# Altium schematic symbol library GyokuRe.SchLib: 1131 symbols (part 8 of 8)
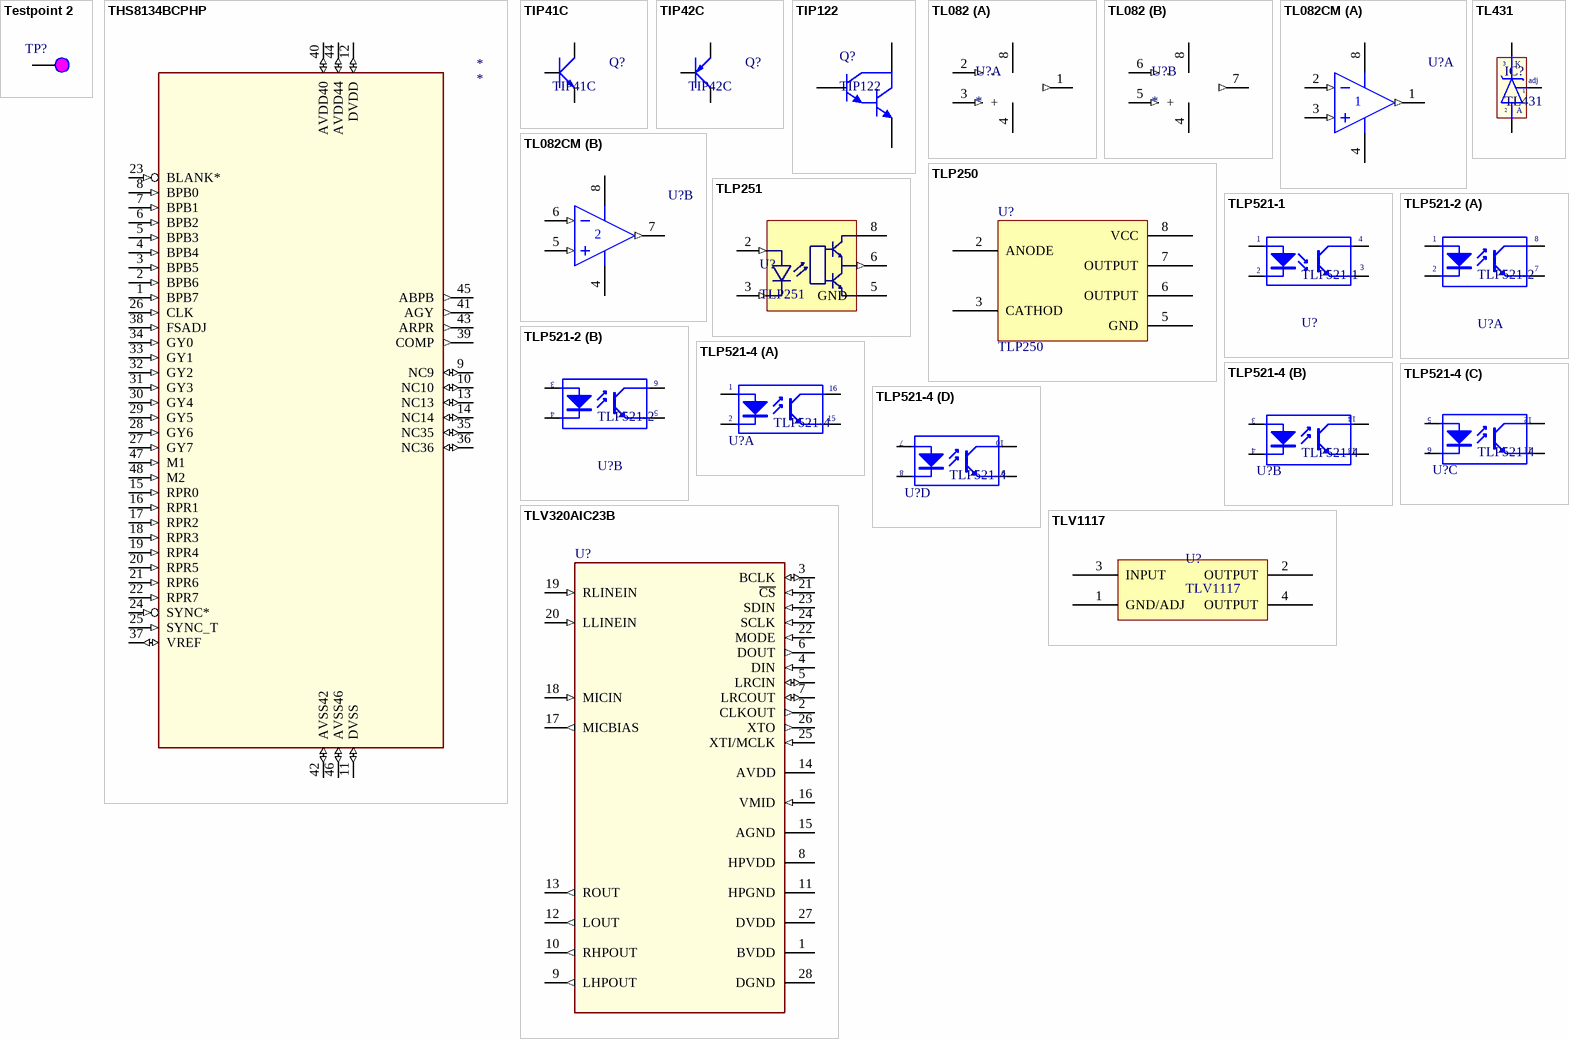
[diagram p56: symbols Testpoint 2 to TLV1117]

## TLV320AIC23B
designator U?  (value not drawn)
utomotive Catalog Stereo Audio CODEC, 8- to 96 kHz, w/Integrated Headphone Amp; Manufacturer: Texas Instruments; Manufacturer P/N: TLV320AIC23B-Q1; Sampling Rate: 96Khz; Resolution: 24-bit; Analog Supply: 2.7 - 3.6 V; Digital Supply: 1.42 - 3.6 V; ComponentLink1Description: Digikey Part Link; ComponentLink2Description: Open Datasheet; ComponentLink2URL: H:\LIBRARY\LIBRARY.Datasheet\tlv320aic23b-q1.pdf
footprint SSOP-28.AIC23 (SSOP, Plastic; 28 Leads; Body Width 5.2 mm; Pitch 0.65 mm)
pins: 1 BVDD (power) "Buffer supply input. Voltage range is from 2.7 V to 3.6 V.", 2 CLKOUT (out) "Clock output. This is a buffered version of the XTI input and is available in 1X or 1/2X frequencies of XTI. Bit 07 in  the sample rate control register controls frequency selection", 3 BCLK (io) "I2S serial-bit clock", 4 DIN (in) "I2S format serial data input to the sigma-delta stereo DAC", 5 LRCIN (io) "I2S DAC-word clock signal.", 6 DOUT (out) "I2S format serial data output from the sigma-delta stereo ADC", 7 LRCOUT (io) "I2S ADC-word clock signal.", 8 HPVDD (power) "Analog headphone amplifier supply input. Voltage level is 3.3 V nominal.", 9 LHPOUT (out) "Left stereo mixer-channel amplified headphone output", 10 RHPOUT (out) "Right stereo mixer-channel amplified headphone output", 11 HPGND (power) "Analog headphone amplifier supply return", 12 LOUT (out) "Left stereo mixer-channel line output", 13 ROUT (out) "Right stereo mixer-channel line output", 14 AVDD (power) "Analog supply input. Voltage level is 3.3 V nominal.", 15 AGND (power) "Analog supply return", 16 VMID (in) "Midrail voltage decoupling input", 17 MICBIAS (out) "Buffered low-noise-voltage output suitable for electret-microphone-capsule biasing", 18 MICIN (in) "Buffered amplifier input suitable for use with electret-microphone capsules", 19 RLINEIN (in) "Right stereo-line input channel", 20 LLINEIN (in) "Left stereo-line input channe", 21 ~{CS} (in) "Control port input latch/address select. For SPI control mode this input acts as the data latch control. For 2-wire  control mode this input defines the seventh bit in the device address field", 22 MODE (in) "Serial-interface-mode input", 23 SDIN (in) "Control-port serial-data input", 24 SCLK (in) "Control-port serial-data clock", 25 XTI/MCLK (in) "Crystal or external-clock input", 26 XTO (out) "Crystal output", 27 DVDD (power) "Digital supply input. Voltage range is 1.4 V to 3.6 V.", 28 DGND (power) "Digital supply return"

## TLV1117
designator U?
Adjustable And Fixed Low-Dropout Voltage Regulator
footprint SOT223-4M (SOT223, 4-Leads, Body 6.5x3.5mm, Pitch 2.3mm, Lead Span 7mm, IPC Low Density)
footprint SOT223-4M-A (Connector; Header; 3 Position; Solder Pad 35mil)
pins: 1 GND/ADJ, 2 OUTPUT, 3 INPUT, 4 OUTPUT

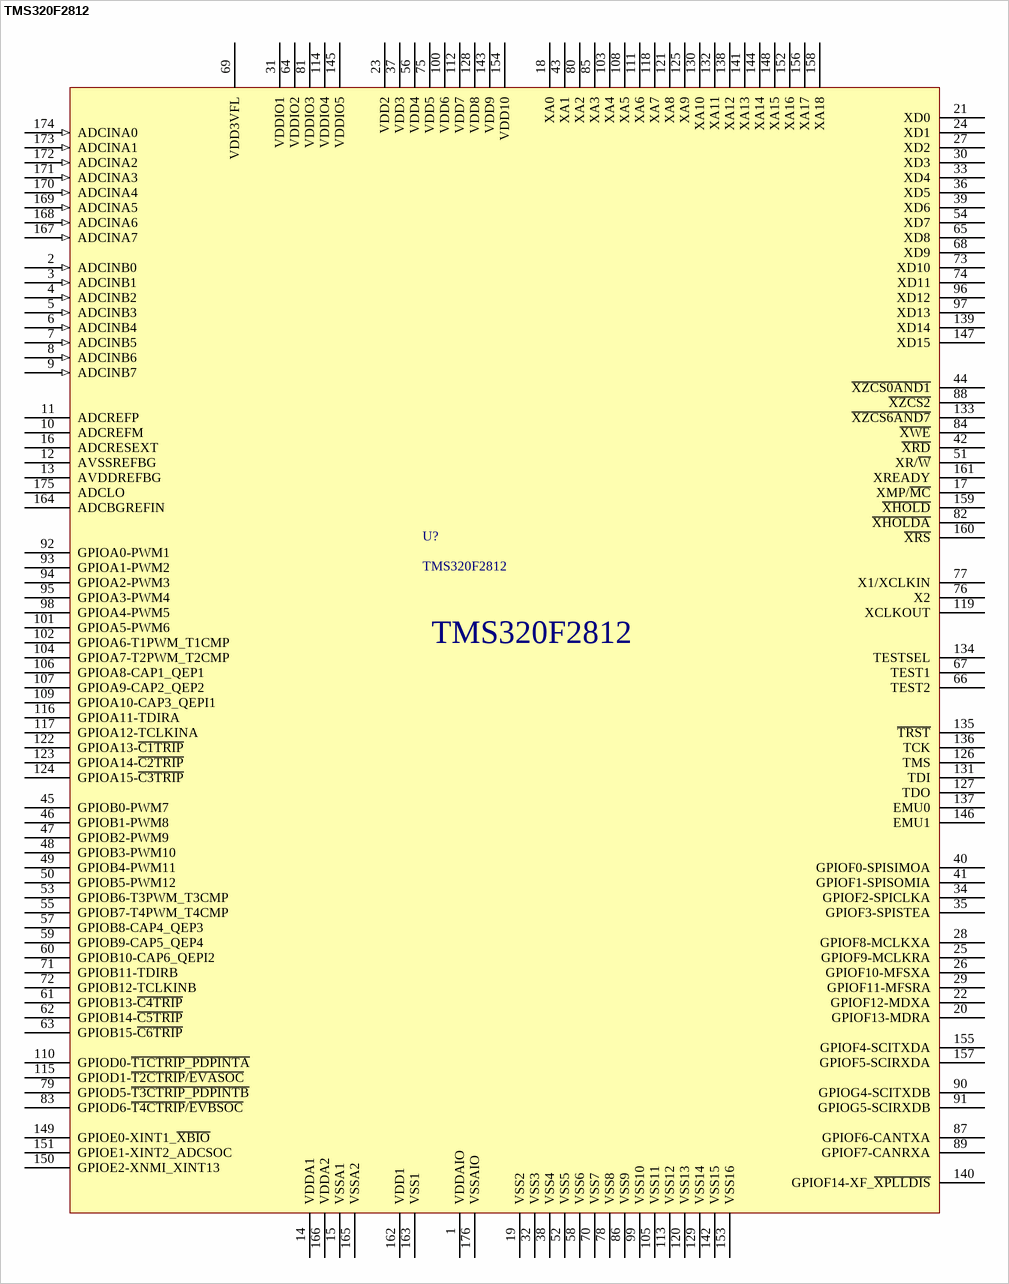
[diagram p44: symbol TMS320F2812]

## TMS320F2812
designator U?
Digital Signal Processors; Manufacture: Texas Instruments
footprint QFP-24x24-0.5-176 (176-Pin Plastic Quad Flat Pack, Body 24mmx24mm, Pitch 0.5 m)
footprint QFP-24x24-0.5-176-A (176-Pin Plastic Quad Flat Pack, Body 24mmx24mm, Pitch 0.5 m; Adaptor)
pins: 1 VDDAIO, 2 ADCINB0 (in), 3 ADCINB1 (in), 4 ADCINB2 (in), 5 ADCINB3 (in), 6 ADCINB4 (in), 7 ADCINB5 (in), 8 ADCINB6 (in), 9 ADCINB7 (in), 10 ADCREFM, 11 ADCREFP, 12 AVSSREFBG, 13 AVDDREFBG, 14 VDDA1, 15 VSSA1, 16 ADCRESEXT, 17 XMP/~{MC}, 18 XA0, 19 VSS2, 20 GPIOF13-MDRA, 21 XD0, 22 GPIOF12-MDXA, 23 VDD2, 24 XD1, 25 GPIOF9-MCLKRA, 26 GPIOF10-MFSXA, 27 XD2, 28 GPIOF8-MCLKXA, 29 GPIOF11-MFSRA, 30 XD3, 31 VDDIO1, 32 VSS3, 33 XD4, 34 GPIOF2-SPICLKA, 35 GPIOF3-SPISTEA, 36 XD5, 37 VDD3, 38 VSS4, 39 XD6, 40 GPIOF0-SPISIMOA, 41 GPIOF1-SPISOMIA, 42 ~{XRD}, 43 XA1, 44 ~{XZCS0AND1}, 45 GPIOB0-PWM7, 46 GPIOB1-PWM8, 47 GPIOB2-PWM9, 48 GPIOB3-PWM10, 49 GPIOB4-PWM11, 50 GPIOB5-PWM12, 51 XR/~{W}, 52 VSS5, 53 GPIOB6-T3PWM_T3CMP, 54 XD7, 55 GPIOB7-T4PWM_T4CMP, 56 VDD4, 57 GPIOB8-CAP4_QEP3, 58 VSS6, 59 GPIOB9-CAP5_QEP4, 60 GPIOB10-CAP6_QEPI2, 61 GPIOB13-~{C4TRIP}, 62 GPIOB14-~{C5TRIP}, 63 GPIOB15-~{C6TRIP}, 64 VDDIO2, 65 XD8, 66 TEST2, 67 TEST1, 68 XD9, 69 VDD3VFL, 70 VSS7, 71 GPIOB11-TDIRB, 72 GPIOB12-TCLKINB, 73 XD10, 74 XD11, 75 VDD5, 76 X2, 77 X1/XCLKIN, 78 VSS8, 79 GPIOD5-~{T3CTRIP_PDPINTB}, 80 XA2, 81 VDDIO3, 82 ~{XHOLDA}, 83 GPIOD6-~{T4CTRIP}/~{EVBSOC}, 84 ~{XWE}, 85 XA3, 86 VSS9, 87 GPIOF6-CANTXA, 88 ~{XZCS2}, 89 GPIOF7-CANRXA, 90 GPIOG4-SCITXDB, 91 GPIOG5-SCIRXDB, 92 GPIOA0-PWM1, 93 GPIOA1-PWM2, 94 GPIOA2-PWM3, 95 GPIOA3-PWM4, 96 XD12, 97 XD13, 98 GPIOA4-PWM5, 99 VSS10, 100 VDD6, 101 GPIOA5-PWM6, 102 GPIOA6-T1PWM_T1CMP, 103 XA4, 104 GPIOA7-T2PWM_T2CMP, 105 VSS11, 106 GPIOA8-CAP1_QEP1, 107 GPIOA9-CAP2_QEP2, 108 XA5, 109 GPIOA10-CAP3_QEPI1, 110 GPIOD0-~{T1CTRIP_PDPINTA}, 111 XA6, 112 VDD7, 113 VSS12, 114 VDDIO4, 115 GPIOD1-~{T2CTRIP}/~{EVASOC}, 116 GPIOA11-TDIRA, 117 GPIOA12-TCLKINA, 118 XA7, 119 XCLKOUT, 120 VSS13, 121 XA8, 122 GPIOA13-~{C1TRIP}, 123 GPIOA14-~{C2TRIP}, 124 GPIOA15-~{C3TRIP}, 125 XA9, 126 TMS, 127 TDO, 128 VDD8, 129 VSS14, 130 XA10, 131 TDI, 132 XA11, 133 ~{XZCS6AND7}, 134 TESTSEL, 135 ~{TRST}, 136 TCK, 137 EMU0, 138 XA12, 139 XD14, 140 GPIOF14-XF_~{XPLLDIS}, 141 XA13, 142 VSS15, 143 VDD9, 144 XA14, 145 VDDIO5, 146 EMU1, 147 XD15, 148 XA15, 149 GPIOE0-XINT1_~{XBIO}, 150 GPIOE2-XNMI_XINT13, 151 GPIOE1-XINT2_ADCSOC, 152 XA16, 153 VSS16, 154 VDD10, 155 GPIOF4-SCITXDA, 156 XA17, 157 GPIOF5-SCIRXDA, 158 XA18, 159 ~{XHOLD}, 160 ~{XRS}, 161 XREADY, 162 VDD1, 163 VSS1, 164 ADCBGREFIN, 165 VSSA2, 166 VDDA2, 167 ADCINA7 (in), 168 ADCINA6 (in), 169 ADCINA5 (in), 170 ADCINA4 (in), 171 ADCINA3 (in), 172 ADCINA2 (in), 173 ADCINA1 (in), 174 ADCINA0 (in), 175 ADCLO, 176 VSSAIO

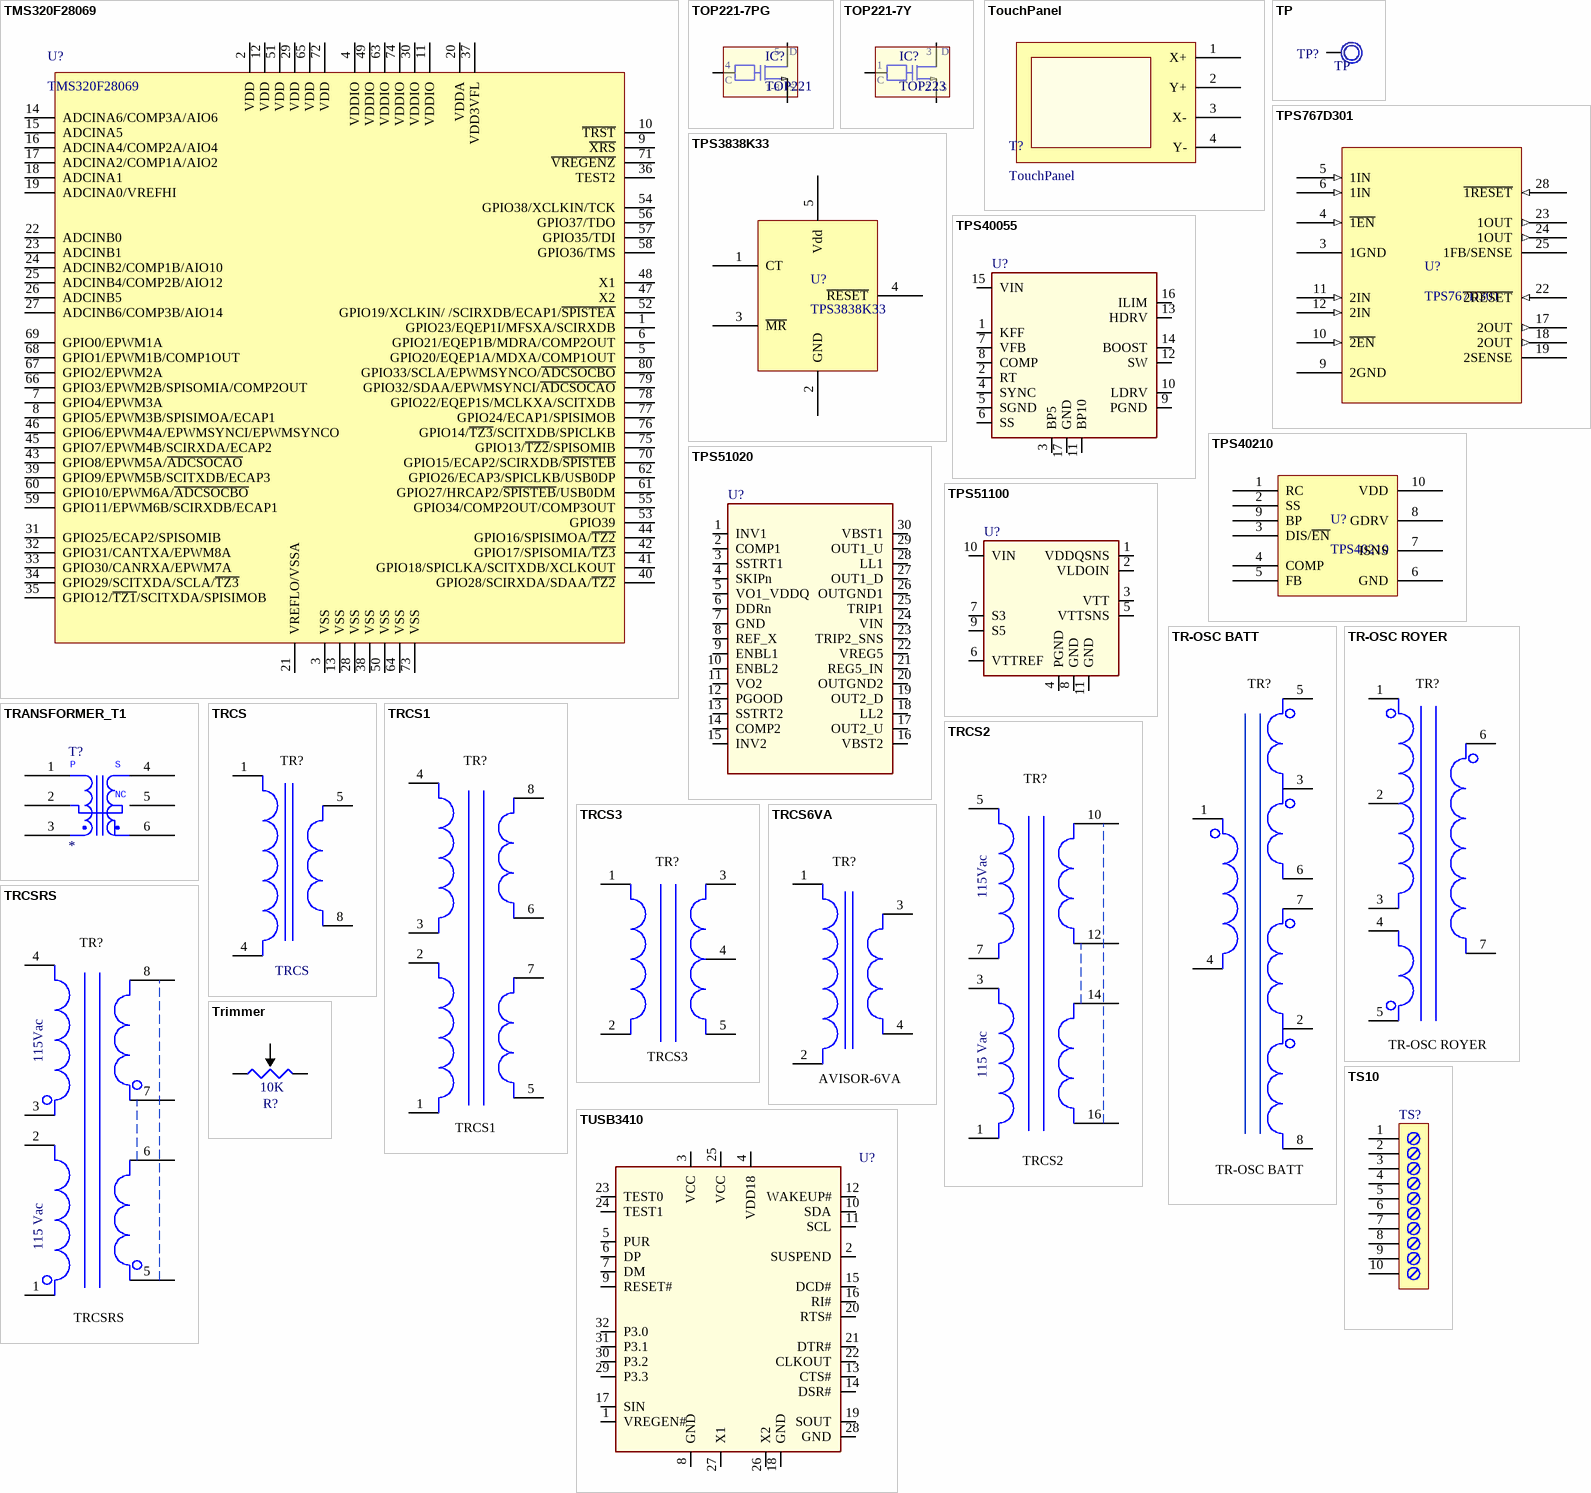
[diagram p45: symbols TMS320F28069 to TUSB3410]

## TMS320F28069
designator U?
Manufacture Company: Texas Instrument
footprint TQFP-80_L (80-Pin Thin Plastic Quad Flat Pack 0.5 mm Pitch, 1.0/0.1 mm Lead Form, IPC High Density)
pins: 1 GPIO23/EQEP1I/MFSXA/SCIRXDB, 2 VDD, 3 VSS, 4 VDDIO, 5 GPIO20/EQEP1A/MDXA/COMP1OUT, 6 GPIO21/EQEP1B/MDRA/COMP2OUT, 7 GPIO4/EPWM3A, 8 GPIO5/EPWM3B/SPISIMOA/ECAP1, 9 ~{XRS}, 10 ~{TRST}, 11 VDDIO, 12 VDD, 13 VSS, 14 ADCINA6/COMP3A/AIO6, 15 ADCINA5, 16 ADCINA4/COMP2A/AIO4, 17 ADCINA2/COMP1A/AIO2, 18 ADCINA1, 19 ADCINA0/VREFHI, 20 VDDA, 21 VREFLO/VSSA, 22 ADCINB0, 23 ADCINB1, 24 ADCINB2/COMP1B/AIO10, 25 ADCINB4/COMP2B/AIO12, 26 ADCINB5, 27 ADCINB6/COMP3B/AIO14, 28 VSS, 29 VDD, 30 VDDIO, 31 GPIO25/ECAP2/SPISOMIB, 32 GPIO31/CANTXA/EPWM8A, 33 GPIO30/CANRXA/EPWM7A, 34 GPIO29/SCITXDA/SCLA/~{TZ3}, 35 GPIO12/~{TZ1}/SCITXDA/SPISIMOB, 36 TEST2, 37 VDD3VFL, 38 VSS, 39 GPIO9/EPWM5B/SCITXDB/ECAP3, 40 GPIO28/SCIRXDA/SDAA/~{TZ2}, 41 GPIO18/SPICLKA/SCITXDB/XCLKOUT, 42 GPIO17/SPISOMIA/~{TZ3}, 43 GPIO8/EPWM5A/~{ADCSOCAO}, 44 GPIO16/SPISIMOA/~{TZ2}, 45 GPIO7/EPWM4B/SCIRXDA/ECAP2, 46 GPIO6/EPWM4A/EPWMSYNCI/EPWMSYNCO, 47 X2, 48 X1, 49 VDDIO, 50 VSS, 51 VDD, 52 GPIO19/XCLKIN/ /SCIRXDB/ECAP1/~{SPISTEA}, 53 GPIO39, 54 GPIO38/XCLKIN/TCK, 55 GPIO34/COMP2OUT/COMP3OUT, 56 GPIO37/TDO, 57 GPIO35/TDI, 58 GPIO36/TMS, 59 GPIO11/EPWM6B/SCIRXDB/ECAP1, 60 GPIO10/EPWM6A/~{ADCSOCBO}, 61 GPIO27/HRCAP2/~{SPISTEB}/USB0DM, 62 GPIO26/ECAP3/SPICLKB/USB0DP, 63 VDDIO, 64 VSS, 65 VDD, 66 GPIO3/EPWM2B/SPISOMIA/COMP2OUT, 67 GPIO2/EPWM2A, 68 GPIO1/EPWM1B/COMP1OUT, 69 GPIO0/EPWM1A, 70 GPIO15/ECAP2/SCIRXDB/~{SPISTEB}, 71 ~{VREGENZ}, 72 VDD, 73 VSS, 74 VDDIO, 75 GPIO13/~{TZ2}/SPISOMIB, 76 GPIO14/~{TZ3}/SCITXDB/SPICLKB, 77 GPIO24/ECAP1/SPISIMOB, 78 GPIO22/EQEP1S/MCLKXA/SCITXDB, 79 GPIO32/SDAA/EPWMSYNCI/~{ADCSOCAO}, 80 GPIO33/SCLA/EPWMSYNCO/~{ADCSOCBO}

## TOP221-7PG
designator IC?, comment TOP221
Family Three-terminal Off-line PWM Switch
footprint DIP8/W0.3 (8 PIN, W 300mil, Pin to pin 100mil)
footprint SO-8 (8-Pin Small Outline Integrated Circuit 1.27 mm Pitch, IPC Medium Density)
pins: 1 S, 2 S, 3 S, 4 C, 5 D, 6 S, 7 S, 8 S
text: 1-8

## TOP221-7Y
designator IC?, comment TOP223
Family Three-terminal Off-line PWM Switch; Designed by: VanDungEvn
footprint QTO-220 (TO-220 - 1-2-3)
pins: 1 C, 2 C, 3 C
text: D; S

## TouchPanel
designator T?
4 wires touch panel; Creator: Nguyen Ba Bien; Date Created: 14-04-2010
footprint HDR1X4H (Connector; Header; 4 Position; Right Angle)
pins: 1 X+, 2 Y+, 3 X-, 4 Y-

## TP
designator TP?
Test Point; Value: Test Point
footprint TEST_POINT_2MM (Test point)
footprint TEST_POINT_4MM (Test Pad, 1-Pin)
footprint TEST_POINT_8MM (Jac cap 6ly)
pins: 1

## TPS767D301
designator U?
Dual-Output Low-Dropout Voltage Regulator, ADJ/3.3V; Manufacture: Texas Instruments
footprint HSOP-9.8x4.4-0.65-28 (Small Outline Pakage; 28 Leads; Body 4.4 mm; Pitch 0.65 mm; Heatsink)
pins: 3 1GND, 4 ~{1EN} (in), 5 1IN (in), 6 1IN (in), 9 2GND, 10 ~{2EN} (in), 11 2IN (in), 12 2IN (in), 17 2OUT (out), 18 2OUT (out), 19 2SENSE, 22 ~{2RESET} (in), 23 1OUT (out), 24 1OUT (out), 25 1FB/SENSE, 28 ~{1RESET} (in)

## TPS3838K33
designator U?
NanoPower Supervisory Circuits 3.3V
footprint SOT23-2.9x1.6-0.95-5AL (SOT23, 5-Leads, Body 2.9x1.6mm, Pitch 0.95mm, Lead Span 2.8mm, IPC High Density)
pins: 1 CT, 2 GND, 3 ~{MR}, 4 ~{RESET}, 5 Vdd

## TPS40055
designator U?  (value not drawn)
Wide Input (8V-40V) up to 1MHz Frequency Synchronous Buck Controller, source/sink; Manufacturer: Texas Instruments; Iout(Max): 1A; Switching Frequency(Max): 1000Khz; Vout: 0.7-35V; Vin: 8-40V; ComponentLink1Description: Digikey Part Link; ComponentLink2Description: Open Datasheet; ComponentLink2URL: H:\LIBRARY\LIBRARY.Datasheet\
pins: 1 KFF, 2 RT, 3 BP5, 4 SYNC, 5 SGND, 6 SS, 7 VFB, 8 COMP, 9 PGND, 10 LDRV, 11 BP10, 12 SW, 13 HDRV, 14 BOOST, 15 VIN, 16 ILIM, 17 GND

## TPS40210
designator U?
4.5-V to 52-V Input Current Mode Boost Controller
footprint SON-3x3-0.5-10 (SON, 10-Leads, Body 3x3 mm, Pitch 0.5mm, IPC Low Density)
pins: 1 RC, 2 SS, 3 DIS/~{EN}, 4 COMP, 5 FB, 6 GND, 7 ISNS, 8 GDRV, 9 BP, 10 VDD

## TPS51020
designator U?  (value not drawn)
Dual, DDR selectable, Synchronous buck controller; Manufacturer: Texas Instruments; Iout(Max): 20A; Switching Frequency: 450Khz; Vout: 0.9-24V; Vin: 4.5-28V; ComponentLink1Description: Digikey Part Link; ComponentLink2Description: Open Datasheet; ComponentLink2URL: H:\LIBRARY\LIBRARY.Datasheet\
pins: 1 INV1, 2 COMP1, 3 SSTRT1, 4 SKIPn, 5 VO1_VDDQ, 6 DDRn, 7 GND, 8 REF_X, 9 ENBL1, 10 ENBL2, 11 VO2, 12 PGOOD, 13 SSTRT2, 14 COMP2, 15 INV2, 16 VBST2, 17 OUT2_U, 18 LL2, 19 OUT2_D, 20 OUTGND2, 21 REG5_IN, 22 VREG5, 23 TRIP2_SNS, 24 VIN, 25 TRIP1, 26 OUTGND1, 27 OUT1_D, 28 LL1, 29 OUT1_U, 30 VBST1

## TPS51100
designator U?  (value not drawn)
3A Source/Sink DDR terminator Regulator; Manufacturer: Texas Instruments; Vin: 4.75-5.25V; ComponentLink1Description: Digikey Part Link; ComponentLink2Description: Open Datasheet; ComponentLink2URL: H:\LIBRARY\LIBRARY.Datasheet\; Iout(Max): 3A
footprint 10MSOP-PowerPAD (Footprint not found)
pins: 1 VDDQSNS, 2 VLDOIN, 3 VTT, 4 PGND, 5 VTTSNS, 6 VTTREF, 7 S3, 8 GND (power), 9 S5, 10 VIN, 11 GND (power)

## TR-OSC BATT
designator TR?
Tr oscillator for battery power - E30; Vendor: Digikey; Value: *; Published: 13-April-2009; Publisher: Hoang Nguyen; ComponentLink1Description: Digikey Part Link; ComponentLink2Description: Open Datasheet; ComponentLink2URL: H:\LIBRARY\LIBRARY.Datasheet\
footprint TR-OSC BATT (Tr oscillator for battery power - E30)
pins: 1, 2, 3, 4, 5, 6, 7, 8

## TR-OSC ROYER
designator TR?
Royer oscillator - E30; Vendor: Digikey; Value: *; Published: 13-April-2009; Publisher: Hoang Nguyen; ComponentLink1Description: Digikey Part Link; ComponentLink2Description: Open Datasheet; ComponentLink2URL: H:\LIBRARY\LIBRARY.Datasheet\
footprint TR-OSC ROYER (Royer oscillator - E30)
pins: 1, 2, 3, 4, 5, 6, 7

## TRANSFORMER_T1
designator T?
ComponentLink1Description: Digikey Part Link; ComponentLink2Description: Open Datasheet; ComponentLink2URL: H:\LIBRARY\LIBRARY.Datasheet\
pins: 1 IN1, 2 OUT-CT, 3 IN2, 4 OUT1, 5 NC, 6 OUT2
text: P; S

## TRCS
designator TR?  (value not drawn)
Power 3VA - Body 40x32 mm; Vendor: Digikey; Value: *; Published: 13-April-2009; Publisher: Hoang Nguyen; ComponentLink1Description: Digikey Part Link; ComponentLink2Description: Open Datasheet; ComponentLink2URL: H:\LIBRARY\LIBRARY.Datasheet\
footprint TRCS (Power 3VA - Body 40x32 mm)
pins: 1, 4, 5, 8

## TRCS1
designator TR?  (value not drawn)
Power 3.5VA - Body 44x38 mm - GBC TYPE; Vendor: Digikey; Value: *; Published: 13-April-2009; Publisher: Hoang Nguyen; ComponentLink1Description: Digikey Part Link; ComponentLink2Description: Open Datasheet; ComponentLink2URL: H:\LIBRARY\LIBRARY.Datasheet\
footprint TRCS1 (Power 3.5VA - Body 44x38 mm - GBC TYPE)
pins: 1, 2, 3, 4, 5, 6, 7, 8

## TRCS2
designator TR?  (value not drawn)
Power 5VA - Body 54x44 mm; Vendor: Digikey; Value: *; Published: 13-April-2009; Publisher: Hoang Nguyen; ComponentLink1Description: Digikey Part Link; ComponentLink2Description: Open Datasheet; ComponentLink2URL: H:\LIBRARY\LIBRARY.Datasheet\
footprint TRCS2 (Power 5VA - Body 54x44 mm)
pins: 1, 3, 5, 7, 10, 12, 14, 16
text: 115Vac; 115 Vac

## TRCS3
designator TR?  (value not drawn)
Power 3VA - Body 40x35 mm; Vendor: Digikey; Value: *; Published: 13-April-2009; Publisher: Hoang Nguyen; ComponentLink1Description: Digikey Part Link; ComponentLink2Description: Open Datasheet; ComponentLink2URL: H:\LIBRARY\LIBRARY.Datasheet\
footprint TRCS3 (Power 3VA - Body 40x35 mm)
pins: 1, 2, 3, 4, 5

## TRCS6VA
designator TR?  (value not drawn)
Power 6VA - Body 48x41 mm - AVISOR; Vendor: Digikey; Value: *; Published: 13-April-2009; Publisher: Hoang Nguyen; ComponentLink1Description: Digikey Part Link; ComponentLink2Description: Open Datasheet; ComponentLink2URL: H:\LIBRARY\LIBRARY.Datasheet\
footprint TRCS6VA
pins: 1, 2, 3, 4
text: AVISOR-6VA

## TRCSRS
designator TR?  (value not drawn)
Power 6VA - Body 68x57 mm RS type; Vendor: Digikey; Value: *; Published: 13-April-2009; Publisher: Hoang Nguyen; ComponentLink1Description: Digikey Part Link; ComponentLink2Description: Open Datasheet; ComponentLink2URL: H:\LIBRARY\LIBRARY.Datasheet\
footprint TRCSRS (Power 6VA - Body 68x57 mm RS type)
pins: 1, 2, 3, 4, 5, 6, 7, 8
text: 115Vac; 115 Vac

## Trimmer
designator R?  value 10K  (hidden comment: *)
Trimmer; Vendor: Digikey; Published: 8-Jun-2000; LatestRevisionDate: 04-Mar-2005; LatestRevisionNote: PCB Footprint replaced.; PackageReference: J1-0603; Publisher: Altium Limited; ComponentLink1Description: Digikey Part Link; ComponentLink2Description: Open Datasheet; ComponentLink2URL: H:\LIBRARY\LIBRARY.Datasheet\
signal-integrity model TRIM
footprint RT10
footprint RT11
footprint RT24
footprint TRIM Rect
footprint SLIDER
footprint TM1
footprint TM2
footprint TM3
footprint TM4
footprint TRIM SMD 5x5mm
footprint TRIM-3314JR
footprint Trimmer Trim Pot (Trimmer Trim Pot Variable Resistor 3296)
footprint Trimmer (Trimmer Variable Resistor)
footprint Trim circle
footprint RT24X
footprint VR-4
footprint TrimmerN (Trimmer Variable Resistor)
footprint POT - 24mm
pins: 1, 2, 3

## TS10
designator TS?
Screw Terminal Strip, 10 Way, 2.54 mm Pitch; Vendor: Digikey; Published: 5-Jan-2004; DatasheetDocument: 15-Dec-03; Publisher: Altium Limited; ComponentLink1Description: Digikey Part Link; ComponentLink2Description: Open Datasheet; ComponentLink2URL: H:\LIBRARY\LIBRARY.Datasheet\
footprint TS2.54x10 (Screw Terminal Strip, 10 Way, 2.54 mm Pitch)
pcadlib TS2.54x10 (Screw Terminal Strip, 10 Way, 2.54 mm Pitch)
pins: 1 "Screw Terminal", 2 "Screw Terminal", 3 "Screw Terminal", 4 "Screw Terminal", 5 "Screw Terminal", 6 "Screw Terminal", 7 "Screw Terminal", 8 "Screw Terminal", 9 "Screw Terminal", 10 "Screw Terminal"

## TUSB3410
designator U?  (value not drawn)
RS232/IrDA Serial-to-USB Converter; Manufacturer: Texas Instruments; Vendor: Digikey; USB Speed: Full; Volt: 3.3 V; Published: 13-April-2009; Publisher: Hoang Nguyen; ComponentLink1Description: Digikey Part Link; ComponentLink2Description: Open Datasheet; ComponentLink2URL: H:\LIBRARY\LIBRARY.Datasheet\
pins: 1 VREGEN#, 2 SUSPEND, 3 VCC, 4 VDD18, 5 PUR, 6 DP, 7 DM, 8 GND, 9 RESET#, 10 SDA, 11 SCL, 12 WAKEUP#, 13 CTS#, 14 DSR#, 15 DCD#, 16 RI#, 17 SIN, 18 GND, 19 SOUT, 20 RTS#, 21 DTR#, 22 CLKOUT, 23 TEST0, 24 TEST1, 25 VCC, 26 X2, 27 X1, 28 GND, 29 P3.3, 30 P3.2, 31 P3.1, 32 P3.0

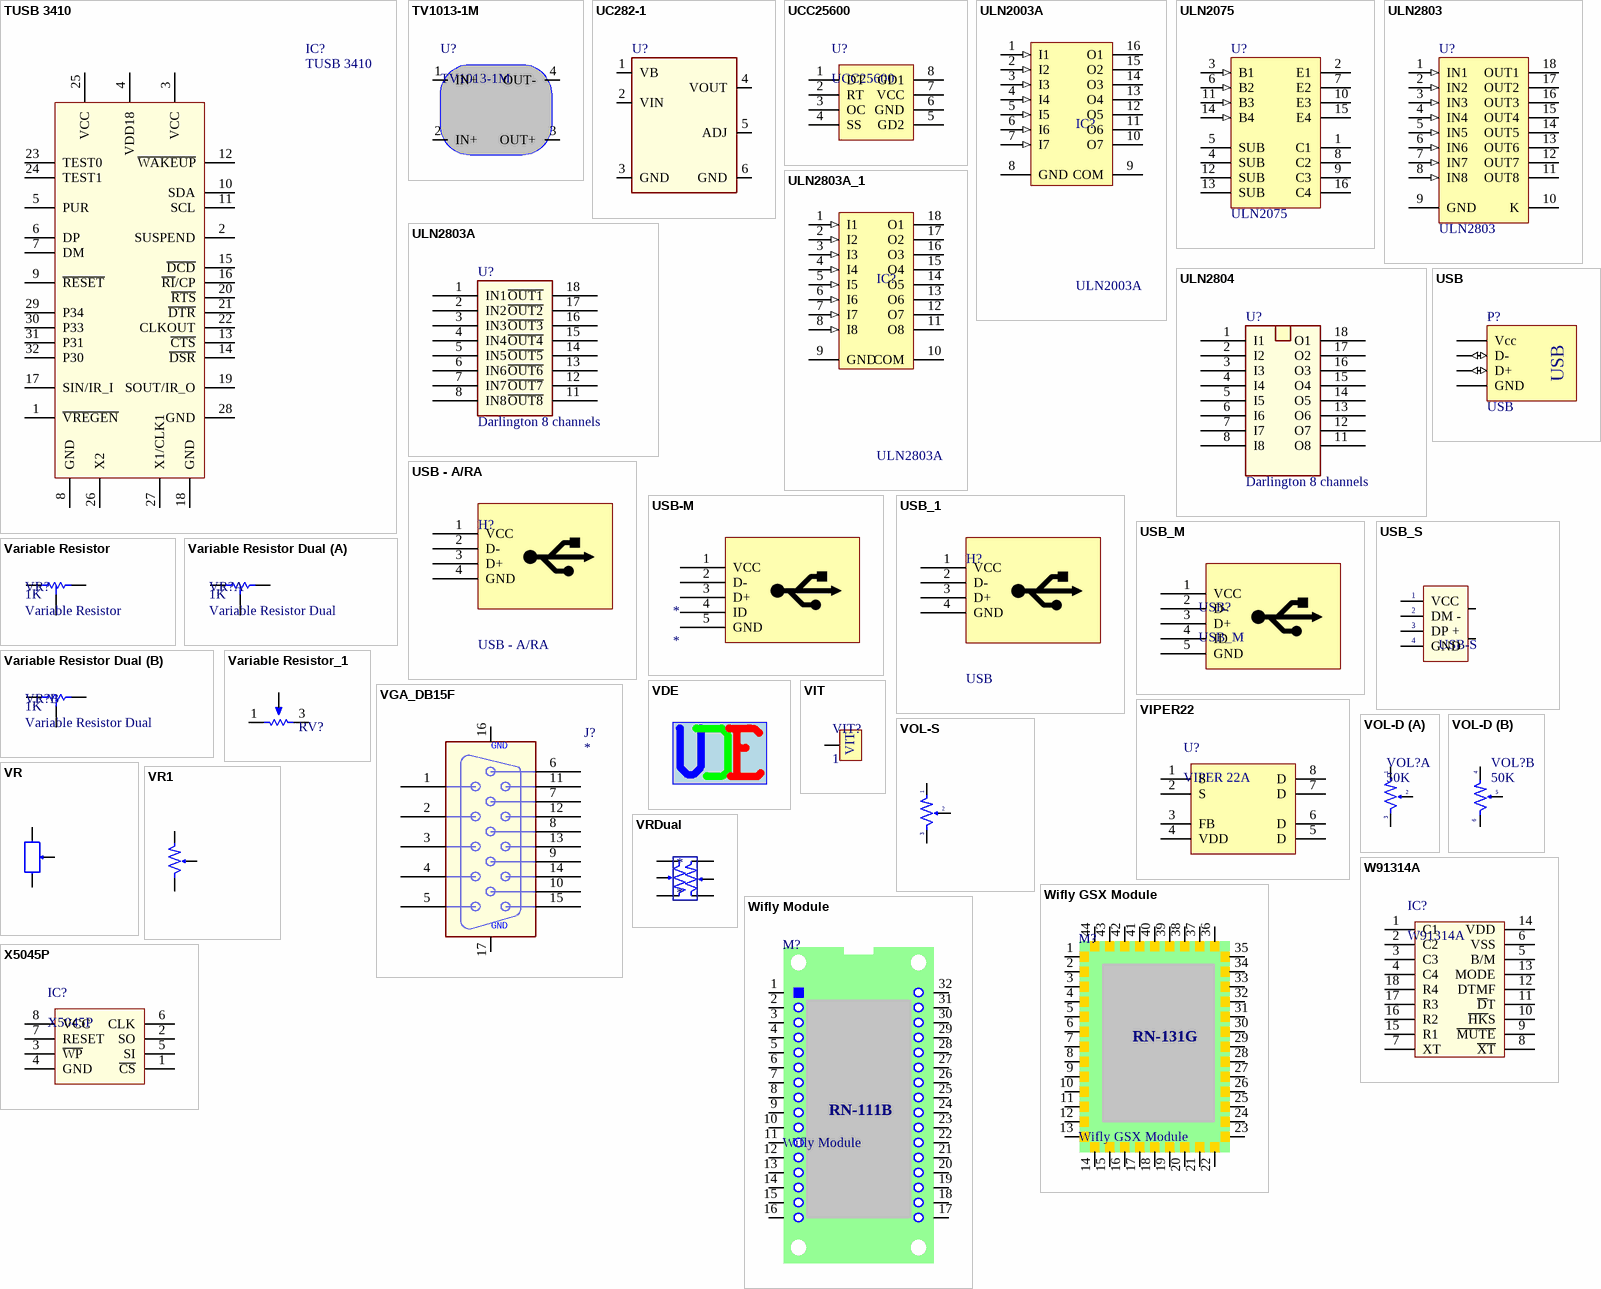
[diagram p46: symbols TUSB 3410 to X5045P]

## TUSB 3410
designator IC?
USB to RS232 Converter; Value: TUSB 3410
footprint QFP7X7-G32/X.45N (QFP; 32 Leads; Body 7 x 7 mm; Pitch 0.8 mm)
pins: 1 ~{VREGEN}, 2 SUSPEND, 3 VCC, 4 VDD18, 5 PUR, 6 DP, 7 DM, 8 GND, 9 ~{RESET}, 10 SDA, 11 SCL, 12 ~{WAKEUP}, 13 ~{CTS}, 14 ~{DSR}, 15 ~{DCD}, 16 ~{RI}/CP, 17 SIN/IR_I, 18 GND, 19 SOUT/IR_O, 20 ~{RTS}, 21 ~{DTR}, 22 CLKOUT, 23 TEST0, 24 TEST1, 25 VCC, 26 X2, 27 X1/CLK1, 28 GND, 29 P34, 30 P33, 31 P31, 32 P30

## TV1013-1M
designator U?
footprint TV1013-1M
pins: 1 IN+, 2 IN+, 3 OUT+, 4 OUT-

## UC282-1
designator U?  (value not drawn)
Single Output LDO, 3.0A, Fixed(1.5V), Fast Transient Response, Low Quiescent Current; Iout(Max): 3A; Volt: 1.85-7.5; ComponentLink1Description: Digikey Part Link; ComponentLink2Description: Open Datasheet; ComponentLink2URL: H:\LIBRARY\LIBRARY.Datasheet\; Vout: 1.5V
footprint 5DDPAK/TO-263 (Footprint not found)
footprint 5TO-220 (Footprint not found)
pins: 1 VB, 2 VIN, 3 GND (power), 4 VOUT, 5 ADJ, 6 GND (power)

## UCC25600
designator U?
footprint UCC25600 (Half bridge resonant)
pins: 1 DT, 2 RT, 3 OC, 4 SS, 5 GD2, 6 GND, 7 VCC, 8 GD1

## ULN2003A
designator IC?
High-Voltage, High-Current Darlington Array; LatestRevisionNote: Stylized 3D Model Added.; Publisher: Altium Limited; Value: ULN2003A
footprint DIP16/W0.3 (16 PIN, W 300mil, Pin to pin 100mil)
footprint SO-G16/X.6 (Small Outline; 16 Leads; Body Width 5.3 mm; Pitch 1.27 mm)
pins: 1 I1 (in), 2 I2 (in), 3 I3 (in), 4 I4 (in), 5 I5 (in), 6 I6 (in), 7 I7 (in), 8 GND (power), 9 COM, 10 O7 (oc), 11 O6 (oc), 12 O5 (oc), 13 O4 (oc), 14 O3 (oc), 15 O2 (oc), 16 O1 (oc)